# Altium footprint library SILICA_PCBLIB.PcbLib: 161 footprints (part 6 of 11)
Each footprint in its own frame and in the unit in brackets; x right, y up, seen from the top. Pads: shape width x height; smd on the part's side, far side on the other; paste and mask are expansions set on the pad; w line width, h text height; cw(c..) or ccw(c..) is an arc to the next point about the centre after c.
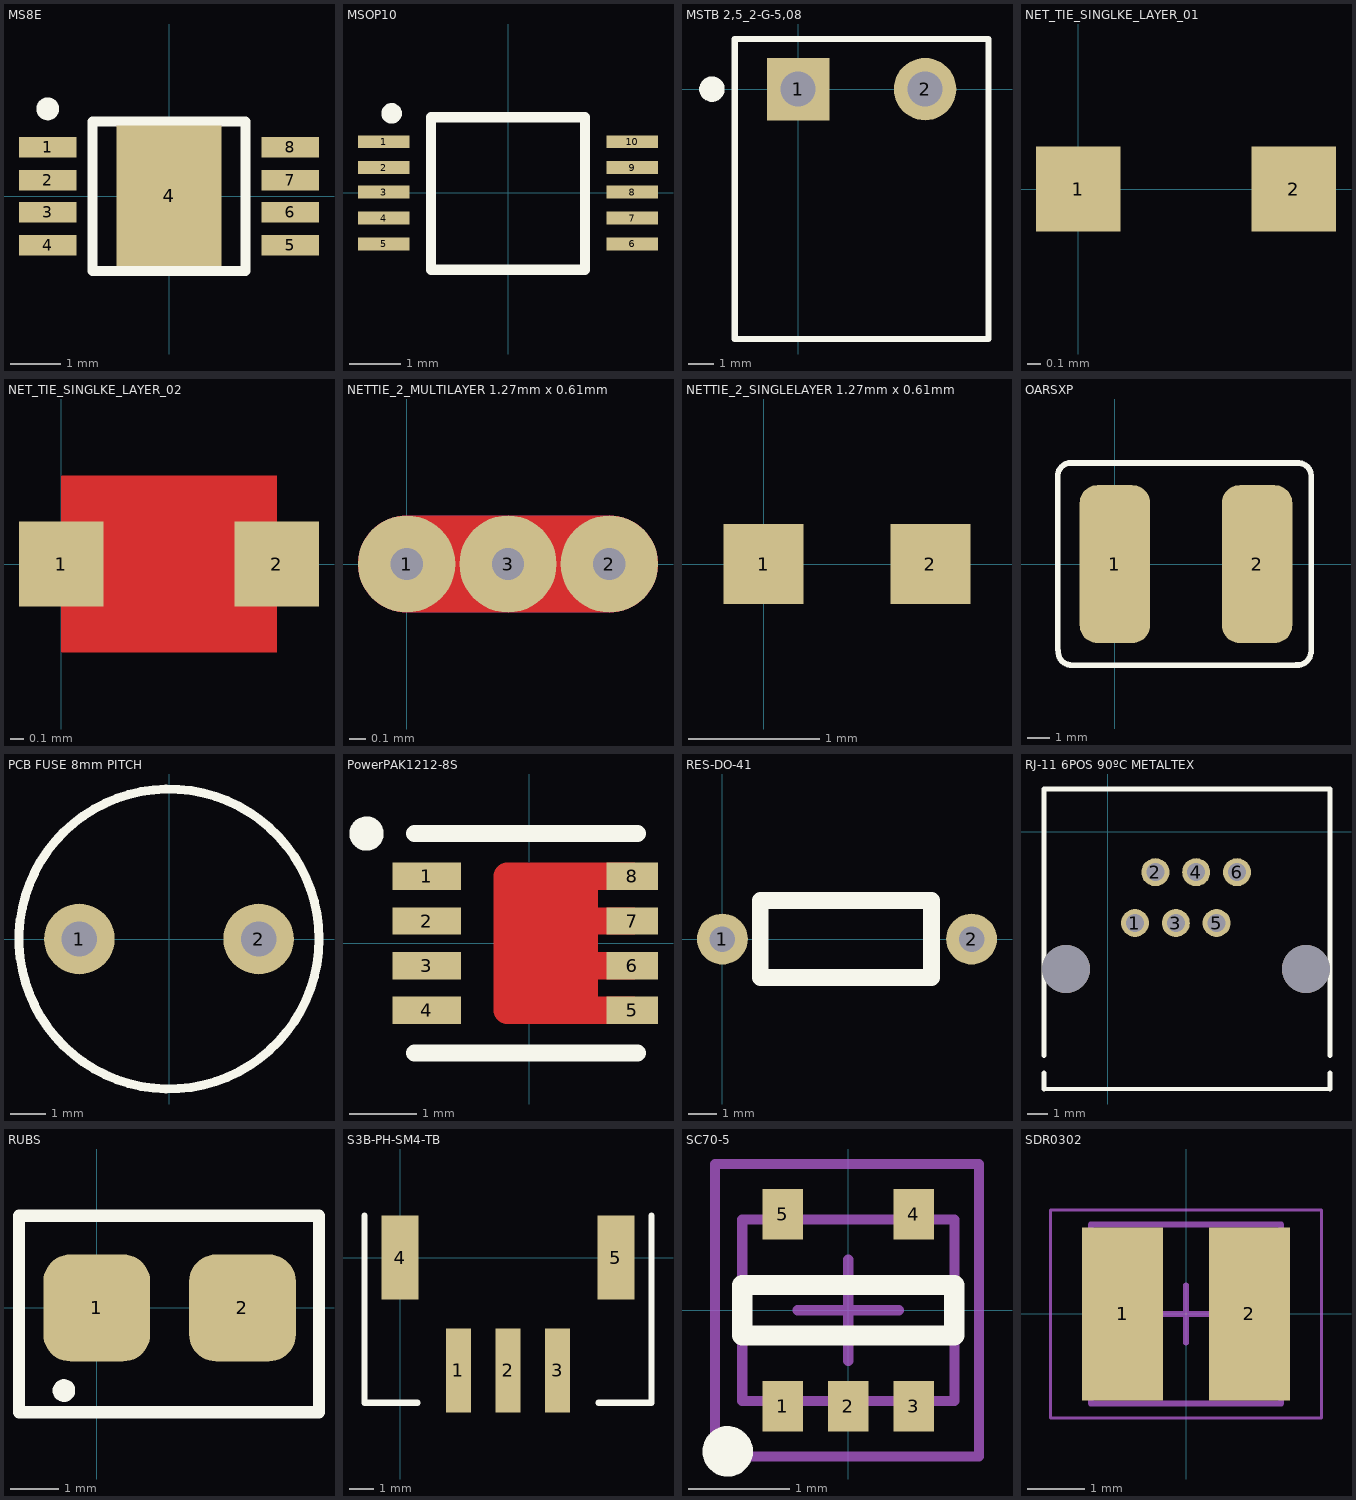
[diagram p5: the footprints below, top view; thin cyan lines are the x and y axes]

## MS8E [mil]
pads (9):
  rect 45x16 smd: 1(-95,38.5) 2(-95,12.5) 3(-95,-12.5) 4(-95,-38.5) 5(95,-38.5) 6(95,-12.5) 7(95,12.5) 8(95,38.5)
  rect 82x110 smd: 4(0,0.5)
Top Overlay:
  circle w10: c-95,68.5 r3.94
  lines w8: -60,-58.5 -60,58.5 60,58.5 60,-58.5 -60,-58.5
3D body "User Library-MSOP8.STEP": height 43.31, standoff 0, extent -95.19,-62.52 99.2,59.53

## MSOP10 [mil]
pads (10):
  rect 40x10 smd: 1(-96,39.5) 2(-96,19.5) 3(-96,0.5) 4(-96,-19.5) 5(-96,-39.5) 6(96,-39.5) 7(96,-19.5) 8(96,0.5) 9(96,19.5) 10(96,39.5)
Top Overlay:
  circle w8: c-90,61.5 r3.94
  lines w8: -59.5,-59.5 -59.5,58.5 59.5,58.5 59.5,-59.5 -59.5,-59.5
3D body: height 5.91, standoff 0, extent 73.5,14.5 97.5,24.5
3D body: height 24.41, standoff 0, extent 73.5,14.5 79,24.5
3D body: height 5.91, standoff 0, extent 73.5,-4.5 97.5,5.5
3D body: height 24.41, standoff 0, extent 73.5,-4.5 79,5.5
3D body: height 5.91, standoff 0, extent 73.5,-24.5 97.5,-14.5
3D body: height 24.41, standoff 0, extent 73.5,-24.5 79,-14.5
3D body: height 24.41, standoff 0, extent 73.5,-44.5 79,-34.5
3D body: height 5.91, standoff 0, extent 73.5,-44.5 97.5,-34.5
3D body: height 24.41, standoff 0, extent 73.5,34.5 79,44.5
3D body: height 5.91, standoff 0, extent 73.5,34.5 97.5,44.5
3D body: height 5.91, standoff 0, extent -97.5,-44.5 -73.5,-34.5
3D body: height 24.41, standoff 0, extent -79,-44.5 -73.5,-34.5
3D body "User Library-msop-10.STEP": height 45.28, standoff 0, extent -96.45,-59.55 96.46,58.56
3D body: height 5.91, standoff 0, extent -97.5,34.5 -73.5,44.5
3D body: height 24.41, standoff 0, extent -79,34.5 -73.5,44.5
3D body: height 24.41, standoff 0, extent -79,14.5 -73.5,24.5
3D body: height 5.91, standoff 0, extent -97.5,14.5 -73.5,24.5
3D body: height 24.41, standoff 0, extent -79,-4.5 -73.5,5.5
3D body: height 5.91, standoff 0, extent -97.5,-4.5 -73.5,5.5
3D body: height 24.41, standoff 0, extent -79,-24.5 -73.5,-14.5
3D body: height 5.91, standoff 0, extent -97.5,-24.5 -73.5,-14.5

## MSTB 2,5_2-G-5,08 [mm]
height 9.2
pads (2):
  rect 2.5x2.5 hole 1.4: 1(0,0)
  round 2.5 hole 1.4: 2(5.08,0)
Top Overlay:
  circle w0.5: c-3.45,0 r0.259
  lines w0.254: -2.54,2 -2.54,-10 7.62,-10 7.62,2 ; -2.54,2.007 7.62,2.007
3D body "1759017.stp": height 8.6, standoff -3.5, extent -2.54,-10 7.62,2.002

## NET_TIE_SINGLKE_LAYER_01 [mm]
pads (2):
  rect 0.61x0.61 all layers, no hole paste+0: 1(0,0) 2(1.549,0)
Multi-Layer:
  region: 0,-0.635 1.549,-0.635 1.549,0.635 0,0.635

## NET_TIE_SINGLKE_LAYER_02 [mm]
pads (2):
  rect 0.61x0.61 smd paste-1: 1(0,0) 2(1.549,0)
Top Layer:
  region: 0,-0.635 1.549,-0.635 1.549,0.635 0,0.635

## NETTIE_2_MULTILAYER 1.27mm x 0.61mm [mil]
pads (3):
  round 24 hole 8 paste-2 mask+0: 1(0,0) 2(50,0) 3(25,0)
Top Layer:
  lines w24: 0,0 50,0
Bottom Layer:
  lines w24: 0,0 50,0

## NETTIE_2_SINGLELAYER 1.27mm x 0.61mm [mil]
pads (2):
  rect 24x24 all layers, no hole paste-24 mask-24: 1(0,0)
  rect 24x24 all layers, no hole paste-24.02 mask-24.02: 2(50,0)
Multi-Layer:
  region: 0,45 50,45 50,-45 0,-45

## OARSXP [mm] "SMD SENSE RESISTOR TT ELETRONICS SERIES"
pads (2):
  rrect50% 3.18x7.11 smd mask+0.102: 1(0,0) 2(6.41,0)
Top Overlay:
  lines w0.254: -2.575,-3.875 -2.575,4.025 cw(c-1.985,3.965) -1.925,4.555 ; -2.55,-3.9 ccw(c-1.96,-3.96) -2.02,-4.55 ; -2.09,4.555 8.295,4.555 ; -2.02,-4.555 8.295,-4.555 ; 8.175,-4.55 ccw(c8.235,-3.96) 8.825,-4.02 ; 8.32,4.55 cw(c8.26,3.96) 8.85,3.9 8.85,-3.995
3D body "User Library-OARS_Sense_Resistor.STEP": height 3.05, standoff 0, extent -2.34,-1.425 8.84,1.75

## PCB FUSE 8mm PITCH [mm]
pads (2):
  round 2 hole 1: 1(-2.54,0) 2(2.54,0)
Top Overlay:
  circle w0.254: c0,0 r4.25

## PowerPAK1212-8S [mil]
pads (8):
  rect 40x16 smd: 1(-60,39) 2(-60,13) 3(-60,-13) 4(-60,-39)
  rect 30x16 smd: 5(60,-39) 6(60,-13) 7(60,13) 8(60,39)
Top Layer:
  lines w16: -13,-13 60,-13 ; -13,13 60,13 ; 2,-39 2,39 ; 17,-39 17,39 ; 32,-39 32,39 ; 60,-39 -13,-39 ; 60,39 -13,39 ; -13,-39 -13,39 ; -13,-39 -13,39
Top Overlay:
  circle w10: c-95,64 r5
  lines w10: -67,-64 63,-64 ; -67,64 63,64
Top Solder:
  rectangle: -25,-51 41,51
3D body: height 11.02, standoff 0, extent -60,-60 60,60
3D body: height 40.94, standoff 11.02, extent -57,-57 57,57
3D body: height 11.02, standoff 0, extent -65,33 -60,45
3D body: height 11.02, standoff 0, extent -65,7 -60,19
3D body: height 11.02, standoff 0, extent -65,-19 -60,-7
3D body: height 11.02, standoff 0, extent -65,-45 -60,-33
3D body: height 11.02, standoff 0, extent 60,33 65,45
3D body: height 11.02, standoff 0, extent 60,7 65,19
3D body: height 11.02, standoff 0, extent 60,-19 65,-7
3D body: height 11.02, standoff 0, extent 60,-45 65,-33
3D body: height 11.02, standoff 0, extent -14,60 -4.5,65
3D body: height 11.02, standoff 0, extent -14,-65 -4.5,-60

## RES-DO-41 [mm] "DO-41"
pads (2):
  round 1.8 hole 0.9: 1(0,0) 2(8.8,0)
Top Overlay:
  lines w0.6: 1.335,-1.358 1.335,-0.761 1.335,1.36 7.385,1.36 7.385,-1.358 1.335,-1.358
3D body "User Library-Resistor_PTH_CFR-25_Yageo_250mW.STEP": height 2.4, standoff -2.6, extent -0.275,-1.2 9.165,1.2

## RJ-11 6POS 90ºC METALTEX [mm]
pads (8):
  round 1.4 hole 0.9: 1(1.35,-4.562) 2(2.37,-2.022) 3(3.39,-4.562) 4(4.41,-2.022) 5(5.43,-4.562) 6(6.45,-2.022)
  round 2.4 hole 2.4 unplated: ""(-2.1,-6.862) ""(9.9,-6.862)
Top Overlay:
  lines w0.2: -3.2,-12.86 11.1,-12.86
  lines w0.254: -3.2,-12.86 -3.2,-12.07 ; -3.2,-11.184 -3.2,2.138 11.1,2.138 11.1,-11.184 ; 11.1,-12.86 11.1,-12.07
3D body "User Library-RJ11-6PM.STEP": height 13.4, standoff -2.95, extent -4.25,-11.98 11.562,3.005

## RUBS [mm]
pads (2):
  rrect50% 2.2x2.2 smd mask+0.102: 1(0,0) 2(3,0)
Top Overlay:
  lines w0.254: -0.641,-1.599 ccw(c-0.675,-1.7) -0.6,-1.625 ; -1.6,-2.15 -1.6,1.9 4.575,1.9 4.575,-2.15 -1.6,-2.15
3D body "SW3dPS-Solid Tantalum Chip CapacitorA1206.STEP": height 2.11, standoff -0.04, extent -0.992,-1.574 4.007,1.424

## S3B-PH-SM4-TB [mm] "3 Positions Header Connector 0.079\" (2.00mm) Surface Mount, Right Angle Tin"
height 5.5
pads (5):
  rect 1x3.4 smd: 1(2.35,-4.55) 2(4.35,-4.55) 3(6.35,-4.55)
  rect 1.5x3.4 smd: 4(0,0) 5(8.7,0)
Top Overlay:
  lines w0.254: -1.438,1.687 -1.438,-5.85 0.7,-5.85 ; 8,-5.85 10.138,-5.85 10.138,1.7
3D body "S3B-PH-SM4-TB.STEP": height 5.58, standoff -0.02, extent -0.587,-5.575 9.313,3.025

## SC70-5 [mm]
height 1.45
pads (5):
  rect 0.4x0.5 smd paste-0.051 mask+0: 1(-0.65,-0.95) 2(0,-0.95) 3(0.65,-0.95) 4(0.65,0.95) 5(-0.65,0.95)
Top Overlay:
  circle w0.25: c-1.194,-1.397 r0.125
  lines w0.2: -1.05,-0.25 1.05,-0.25 1.05,0.25 -1.05,0.25 -1.05,-0.25
Mechanical 13:
  lines w0.1: -1.05,-0.9 -1.05,0.9 1.05,0.9 1.05,-0.9 -1.05,-0.9
Mechanical 15:
  lines w0.1: -0.5,0 0.5,0 ; 0,-0.5 0,0.5 ; -1.321,-1.448 -1.321,1.448 1.295,1.448 1.295,-1.448 -1.321,-1.448
3D body "User Library-SC70-5-1.STEP": height 0.95, standoff 0, extent -1,-1.05 1,1.05

## SDR0302 [mm] "SDR0302 Series - SMD Power Inductors"
height 2.8
pads (2):
  rect 1.4x3 smd: 1(-1.1,0) 2(1.1,0)
Mechanical 13:
  lines w0.1: -1.65,-1.55 -1.65,1.55 1.65,1.55 1.65,-1.55 -1.65,-1.55
Mechanical 15:
  lines w0.05: -2.35,-1.8 -2.35,1.8 2.35,1.8 2.35,-1.8 -2.35,-1.8
  lines w0.1: -0.5,0 0.5,0 ; 0,-0.5 0,0.5
3D body "User Library-SDR0302.STEP": height 3, standoff 0, extent -1.5,-1.488 1.5,1.488